# Altium footprint library SwagePCB.PcbLib: 117 footprints (part 2 of 8)
Each footprint in its own frame and in the unit in brackets; x right, y up, seen from the top. Pads: shape width x height; smd on the part's side, far side on the other; paste and mask are expansions set on the pad; w line width, h text height; cw(c..) or ccw(c..) is an arc to the next point about the centre after c.
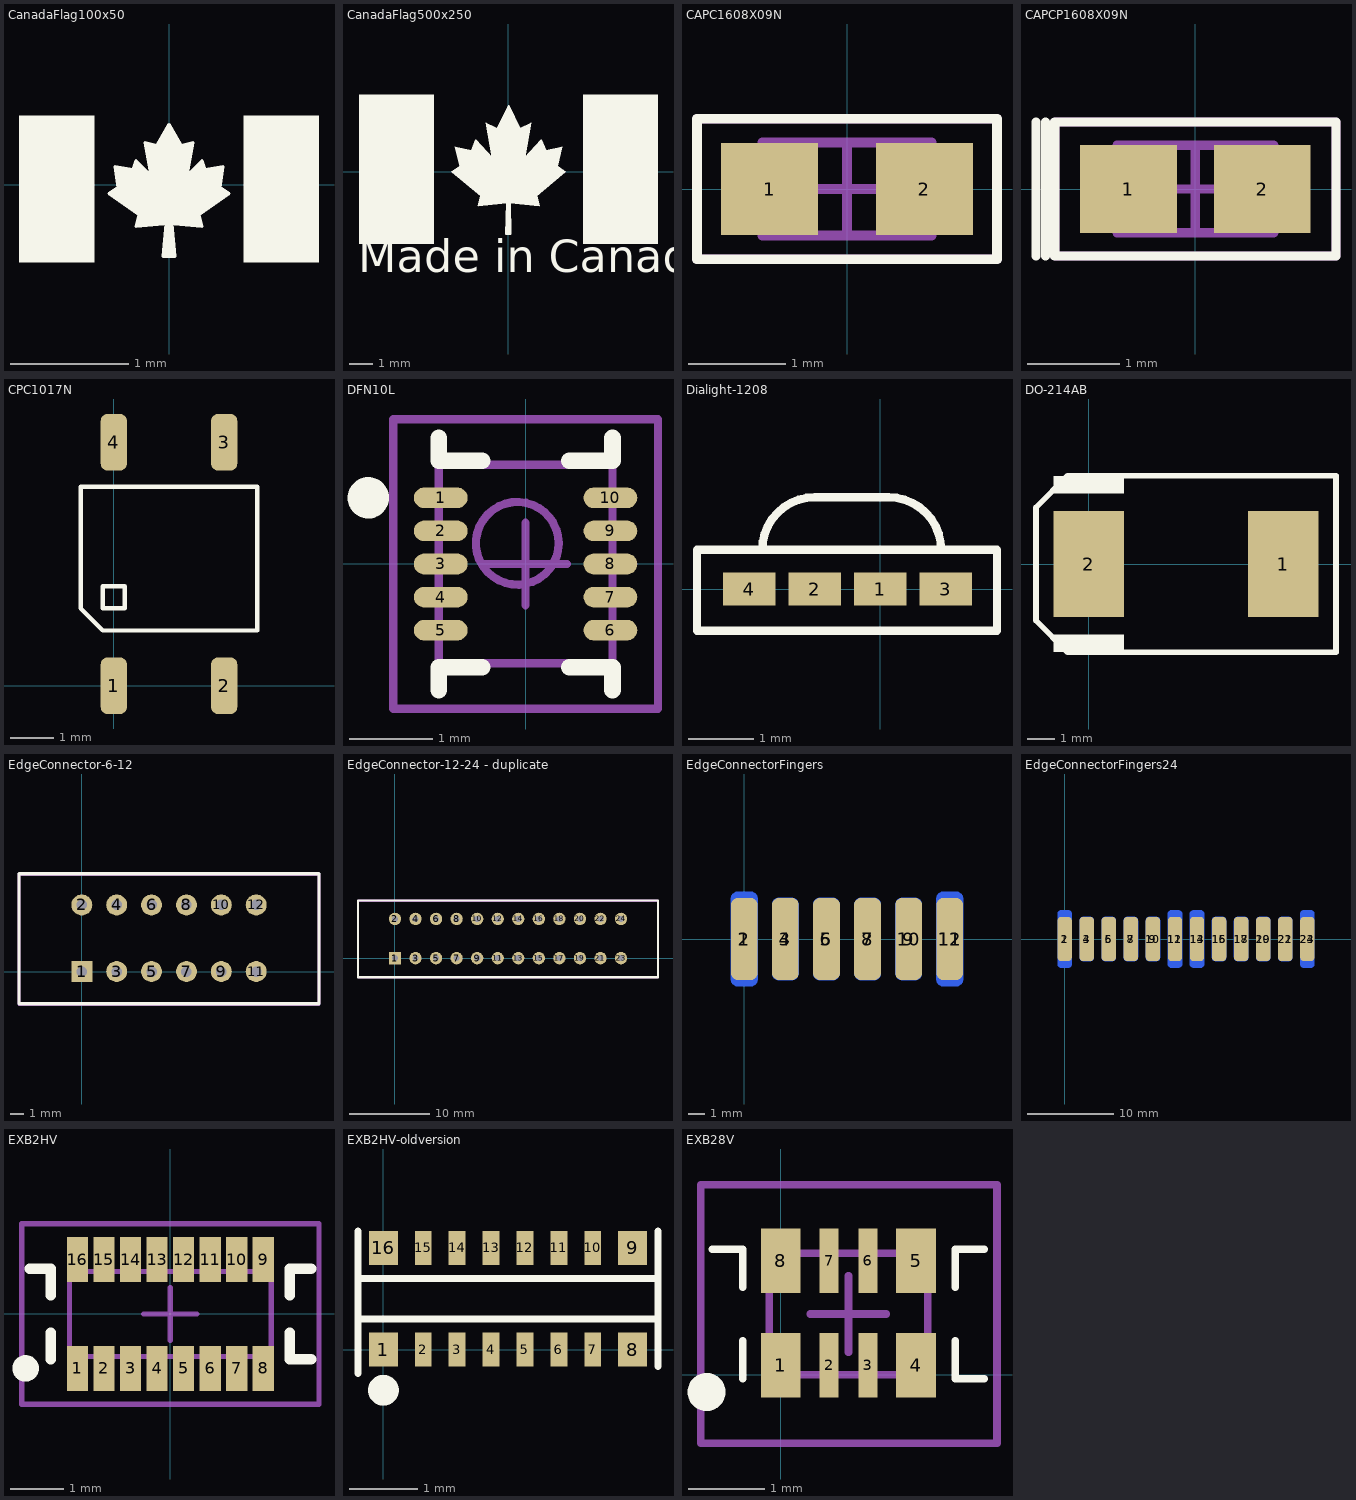
[diagram p1: the footprints below, top view; thin cyan lines are the x and y axes]

## CanadaFlag100x50 [mm] "Canada Flag, 100x50 mils"
Top Overlay:
  region: 0,0.508 0.051,0.406 0.102,0.33 0.203,0.356 0.152,0.076 0.279,0.203 0.305,0.127 0.457,0.152 0.432,-0.025 0.508,-0.076 0.254,-0.254 0.279,-0.356 0.051,-0.33 0.025,-0.33 0.051,-0.61 -0.051,-0.61 -0.051,-0.584 -0.025,-0.33 -0.279,-0.356 -0.254,-0.254 -0.508,-0.076 -0.432,-0.025 -0.457,0.152 -0.305,0.127 -0.279,0.203 -0.152,0.076 -0.178,0.229 -0.203,0.356 -0.102,0.33 -0.051,0.406
  region: 0.635,0.584 0.635,-0.66 1.27,-0.66 1.27,0.584
  region: -1.27,0.584 -1.27,-0.66 -0.635,-0.66 -0.635,0.584
  lines w0.025: -0.025,-0.333 -0.051,-0.61 0.051,-0.61 0.025,-0.333 ; -0.508,-0.076 -0.432,-0.025 -0.457,0.152 -0.305,0.127 -0.279,0.203 -0.152,0.076 -0.203,0.356 -0.102,0.33 0,0.508 0.102,0.33 0.203,0.356 0.152,0.076 0.279,0.203 0.305,0.127 0.457,0.152 0.432,-0.025 0.508,-0.076 0.254,-0.254 0.279,-0.356 0,-0.33 -0.279,-0.356 -0.254,-0.254 -0.508,-0.076

## CanadaFlag500x250 [mm] "CanadaFlag, 500x250 mils"
Top Overlay:
  region: -6.325,3.277 -3.15,3.277 -3.15,-3.073 -6.325,-3.073
  region: 3.2,3.277 6.375,3.277 6.375,-3.073 3.2,-3.073
  region: 0.025,2.819 0.508,1.854 0.991,2.083 0.737,0.61 1.422,1.346 1.6,0.914 2.311,1.067 2.108,0.229 2.438,0 1.219,-1.016 1.321,-1.448 0.102,-1.321 0.127,-2.667 -0.102,-2.667 -0.051,-1.321 -1.27,-1.448 -1.168,-1.016 -2.388,0 -2.057,0.229 -2.261,1.067 -1.549,0.914 -1.372,1.346 -0.94,0.864 -0.686,0.61 -0.94,2.083 -0.533,1.89 -0.457,1.854
  lines w0.025: -2.388,0 -1.168,-1.016 -1.27,-1.448 -0.051,-1.321 -0.102,-2.667 0.127,-2.667 0.102,-1.321 1.321,-1.448 1.219,-1.016 2.438,0 2.108,0.229 2.311,1.067 1.6,0.914 1.422,1.346 0.737,0.61 0.991,2.083 0.508,1.854 0.025,2.819 -0.457,1.854 -0.94,2.083 -0.686,0.61 -1.372,1.346 -1.549,0.914 -2.261,1.067 -2.057,0.229 -2.388,0
  text "Made in Canada" at -6.375,-4.75 h2.36

## CAPC1608X09N [mm] "Chip Capacitor, 2-Leads, Body 1.6x0.8mm, IPC Medium Density"
height 0.9
pads (2):
  rect 1x0.95 smd: 1(-0.8,0) 2(0.8,0)
Top Overlay:
  lines w0.1: -1.55,-0.725 1.55,-0.725 1.55,0.725 -1.55,0.725 -1.55,-0.725
Mechanical 13:
  lines w0.1: -0.875,-0.48 -0.875,0.48 0.875,0.48 0.875,-0.48 -0.875,-0.48
Mechanical 15:
  lines w0.1: -0.48,0 0.48,0 ; 0,-0.48 0,0.48 ; -1.55,-0.725 -1.55,0.725 1.55,0.725 1.55,-0.725 -1.55,-0.725
3D body: height 0.9, standoff 0, extent -0.875,-0.48 0.875,0.48

## CAPCP1608X09N [mm] "Chip Capacitor, 2-Leads, Body 1.6x0.8mm, IPC Medium Density"
height 0.9
pads (2):
  rect 1.05x0.95 smd: 1(-0.725,0) 2(0.725,0)
Top Overlay:
  lines w0.1: -1.727,-0.725 -1.727,0.725 ; -1.626,-0.725 -1.626,0.725 ; -1.525,-0.725 1.525,-0.725 1.525,0.725 -1.525,0.725 -1.525,-0.725
Mechanical 13:
  lines w0.1: -0.85,-0.475 -0.85,0.475 0.85,0.475 0.85,-0.475 -0.85,-0.475
Mechanical 15:
  lines w0.1: -0.475,0 0.475,0 ; 0,-0.475 0,0.475 ; -1.525,-0.725 -1.525,0.725 1.525,0.725 1.525,-0.725 -1.525,-0.725
3D body: height 0.9, standoff 0, extent -0.85,-0.475 0.85,0.475

## CPC1017N [mm] "Relay, SPST, NO, Optically Isolated"
pads (4):
  rrect50% 0.6x1.3 smd: 1(0,0) 2(2.54,0) 3(2.54,5.6) 4(0,5.6)
Top Overlay:
  lines w0.102: -0.762,2.032 -0.762,1.778 ; -0.762,1.778 -0.762,4.572 3.302,4.572 3.302,1.27 -0.254,1.27 -0.762,1.778 ; -0.254,1.778 0.254,1.778 0.254,2.286 -0.254,2.286 -0.254,1.778
3D body: height 2.18, standoff 0.06, extent -0.762,1.27 3.302,4.572

## DFN10L [mm] "2 x 2.3mm"
height 0.6
pads (10):
  oval 0.65x0.25 smd: 1(-1.025,0.8) 2(-1.025,0.4) 3(-1.025,0) 4(-1.025,-0.4) 5(-1.025,-0.8) 6(1.025,-0.8) 7(1.025,-0.4) 8(1.025,0) 9(1.025,0.4) 10(1.025,0.8)
Top Overlay:
  circle w0.25: c-1.9,0.8 r0.125
  lines w0.2: -1.05,-1.525 -1.05,-1.25 -0.525,-1.25 ; -1.05,1.525 -1.05,1.25 -0.525,1.25 ; 0.525,-1.25 1.05,-1.25 1.05,-1.525 ; 0.525,1.25 1.05,1.25 1.05,1.525
Mechanical 13:
  circle w0.1: c-0.1,0.25 r0.5
  lines w0.1: -1.05,-1.2 1.05,-1.2 1.05,1.2 -1.05,1.2 -1.05,-1.2
Mechanical 15:
  lines w0.1: -0.5,0 0.5,0 ; 0,-0.5 0,0.5 ; -1.6,-1.75 1.6,-1.75 1.6,1.75 -1.6,1.75 -1.6,-1.75
3D body: height 0.6, standoff 0.05, extent -1.05,-1.2 1.05,1.2

## Dialight-1208 [mm] "Dialight 598 Series SMD LED 1208 Package"
height 1
pads (4):
  rect 0.8x0.5 smd: 1(0,0) 2(-1,0) 3(1,0) 4(-2,0)
Top Overlay:
  lines w0.127: -1.8,0.6 cw(c-1,0.6) -1,1.4 0.125,1.4 ; 0.127,1.4 cw(c0.127,0.6) 0.927,0.6 ; -2.794,-0.635 -2.794,0.6 1.778,0.6 1.778,-0.635 -2.794,-0.635

## DO-214AB [mm]
pads (2):
  rect 2.54x3.81 smd: 1(6.985,0) 2(0,0)
Top Overlay:
  region: -1.27,-2.54 -1.27,-3.175 1.27,-3.175 1.27,-2.54
  region: -1.27,3.175 -1.27,2.54 1.27,2.54 1.27,3.175
  lines w0.203: -1.905,-2.032 -0.762,-3.175 8.89,-3.175 8.89,3.175 -0.762,3.175 -1.905,2.032 -1.905,-2.032
3D body: height 2.62, standoff 0.31, extent -1.3,-3.2 8.9,3.2

## E10-3DModel [mm] "E10 step file model as a component"
3D body "SASRE10_001.step": height 16.19, standoff -3.81, extent -3.482,0.001 91.22,54.001

## EdgeConnector-6-12 [mil] "Connector, Edge, 2x6, PTH"
height 610
pads (12):
  rect 60x60 hole 30: 1(0,0)
  round 60 hole 30: 2(0,191) 3(100,0) 4(100,191) 5(200,0) 6(200,191) 7(300,0) 8(300,191) 9(400,0) 10(400,191) 11(500,0) 12(500,191)
Top Overlay:
  lines w10: -180,-93 678,-93 680,-91 680,280 -180,280 -180,-93
Mechanical 13:
  lines w10: -180,-93.5 680,-93.5 680,279.5 -180,279.5 -180,-93.5
3D body "c-7-5530843-6-f-3d.stp": height 610, standoff -187, extent -180,-93.5 680,279.5

## EdgeConnector-12-24 - duplicate [mil] "Connector, Edge, 2x12, PTH"
height 610
pads (24):
  rect 60x60 hole 30: 1(0,0)
  round 60 hole 30: 2(0,191) 3(100,0) 4(100,191) 5(200,0) 6(200,191) 7(300,0) 8(300,191) 9(400,0) 10(400,191) 11(500,0) 12(500,191) 13(600,0) 14(600,191) 15(700,0) 16(700,191) 17(800,0) 18(800,191) 19(900,0) 20(900,191) 21(1000,0) 22(1000,191) 23(1100,0) 24(1100,191)
Top Overlay:
  lines w10: -180,-93 -180,280 1280,280 1280,-93 -180,-93
Mechanical 13:
  lines w10: -180,-93.5 1280,-93.5 1280,279.5 -180,279.5 -180,-93.5
3D body "c-8-5530843-3-f-3d.stp": height 610, standoff -125, extent -180,-93 1280,280

## EdgeConnectorFingers [mil] "Connector, Edge, Fingers, 12 Pads, 2 Rows, 6 Contacts per row"
pads (12):
  rrect50% 65x200 smd: 1(0,0) 3(100,0) 5(200,0) 7(300,0) 9(400,0) 11(500,0)
  rrect50% 65x230 smd far side: 2(0,0) 12(500,0)
  rrect50% 65x200 smd far side: 4(100,0) 6(200,0) 8(300,0) 10(400,0)

## EdgeConnectorFingers24 [mil] "Connector, Edge, Fingers, 24 Pads, 2 Rows, 12 Contacts per row"
pads (24):
  rrect50% 65x200 smd: 1(0,0) 3(100,0) 5(200,0) 7(300,0) 9(400,0) 11(500,0) 13(600,0) 15(700,0) 17(800,0) 19(900,0) 21(1000,0) 23(1100,0)
  rrect50% 65x260 smd far side: 2(0,0) 12(500,0) 14(600,0) 24(1100,0)
  rrect50% 65x200 smd far side: 4(100,0) 6(200,0) 8(300,0) 10(400,0) 16(700,0) 18(800,0) 20(900,0) 22(1000,0)

## EXB2HV [mm] "LCC, 16-Pins, Body 3.9x1.7mm (max), Pitch 0.50mm, IPC Medium Density"
height 0.55
pads (16):
  rect 0.4x0.85 smd: 1(-1.75,-1.025) 2(-1.25,-1.025) 3(-0.75,-1.025) 4(-0.25,-1.025) 5(0.25,-1.025) 6(0.75,-1.025) 7(1.25,-1.025) 8(1.75,-1.025) 9(1.75,1.025) 10(1.25,1.025) 11(0.75,1.025) 12(0.25,1.025) 13(-0.25,1.025) 14(-0.75,1.025) 15(-1.25,1.025) 16(-1.75,1.025)
Top Overlay:
  circle w0.25: c-2.725,-1.025 r0.125
  lines w0.2: -2.65,0.85 -2.25,0.85 -2.25,0.35 ; -2.25,-0.85 -2.25,-0.35 ; 2.25,-0.35 2.25,-0.85 2.65,-0.85 ; 2.25,0.35 2.25,0.85 2.65,0.85
Mechanical 13:
  lines w0.1: -1.9,-0.8 1.9,-0.8 1.9,0.8 -1.9,0.8 -1.9,-0.8
Mechanical 15:
  lines w0.1: -0.5,0 0.5,0 ; 0,-0.5 0,0.5 ; -2.8,-1.7 2.8,-1.7 2.8,1.7 -2.8,1.7 -2.8,-1.7
3D body: height 0.55, standoff 0, extent -1.9,-0.8 1.9,0.8

## EXB2HV-oldversion [mm] "Resistor Array, Isolated, 8 Resistors"
height 0.55
pads (16):
  rect 0.425x0.5 smd: 1(0,0) 8(3.675,0) 9(3.675,1.5) 16(0,1.5)
  rect 0.25x0.5 smd: 2(0.587,0) 3(1.088,0) 4(1.587,0) 5(2.087,0) 6(2.588,0) 7(3.087,0) 10(3.087,1.5) 11(2.588,1.5) 12(2.087,1.5) 13(1.587,1.5) 14(1.088,1.5) 15(0.587,1.5)
Top Overlay:
  circle w0.254: c0,-0.6 r0.1
  lines w0.102: -0.375,-0.35 -0.375,1.75 ; -0.375,0.45 4.05,0.45 ; -0.375,1.05 4.05,1.05 ; 4.05,-0.25 4.05,1.75

## EXB28V [mm] "LCC, 8-Pins, Body 2.1x1.7mm (max), Pitch 0.50mm, IPC Medium Density"
height 0.55
pads (8):
  rect 0.525x0.85 smd: 1(0,0.127) 4(1.778,0.127) 5(1.778,1.499) 8(0,1.499)
  rect 0.25x0.85 smd: 2(0.635,0.127) 3(1.143,0.127) 6(1.143,1.499) 7(0.635,1.499)
Top Overlay:
  circle w0.25: c-0.975,-0.225 r0.125
  lines w0.1: -0.9,1.65 -0.5,1.65 -0.5,1.15 ; -0.5,-0.05 -0.5,0.45 ; 2.29,0.45 2.29,-0.05 2.67,-0.05 ; 2.29,1.15 2.29,1.65 2.67,1.65
Mechanical 13:
  lines w0.1: -0.15,0 -0.15,1.6 1.93,1.6 1.93,0 -0.15,0
Mechanical 15:
  lines w0.1: 0.385,0.8 1.385,0.8 ; 0.89,0.3 0.89,1.3 ; -1.05,-0.9 -1.05,2.5 2.84,2.5 2.84,-0.9 -1.05,-0.9
3D body: height 0.55, standoff 0, extent -0.15,0 1.93,1.6